# Altium footprint library ALL.PcbLib: 385 footprints (part 23 of 25)
Each footprint in its own frame and in the unit in brackets; x right, y up, seen from the top. Pads: shape width x height; smd on the part's side, far side on the other; paste and mask are expansions set on the pad; w line width, h text height; cw(c..) or ccw(c..) is an arc to the next point about the centre after c.
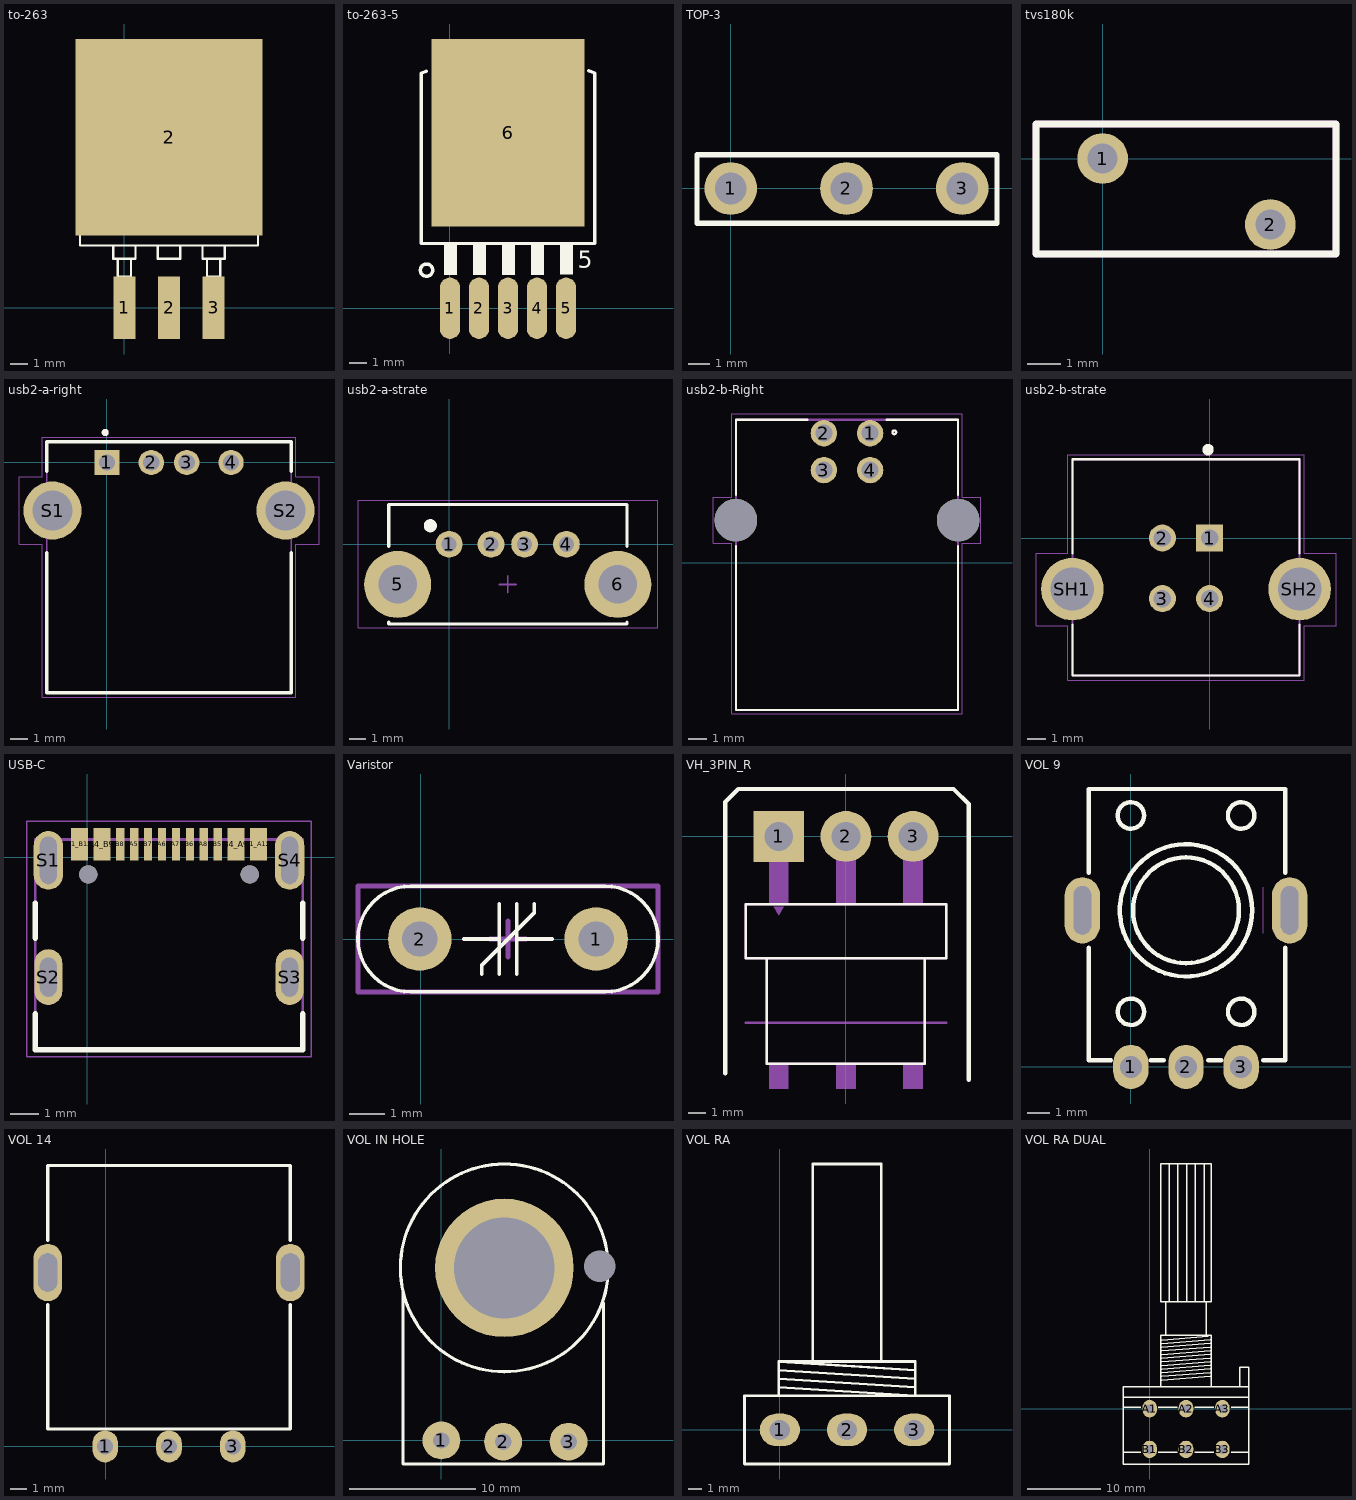
[diagram p22: the footprints below, top view; thin cyan lines are the x and y axes]

## to-263 [mil]
pads (4):
  rect 50x140 smd: 1(0,0) 2(100,0) 3(200,0)
  rect 420x440.94 smd: 2(100,382.83)
Top Overlay:
  lines w5: -25,140 -25,110 25,110 25,140 ; -15,110 -15,70 15,70 15,110 ; 75,140 75,110 125,110 125,140 ; 175,140 175,110 225,110 225,140 ; 185,110 185,70 215,70 215,110 ; -100,140 -100,520 -100,550 -70,565 270,565 300,550 300,520 300,140 -100,140
3D body "SW3dPS-TO263-3S.STEP": height 189.36, standoff 0.39, extent -95.21,-43.32 298.49,573.61

## to-263-5 [mm]
pads (6):
  oval 1.2x3.6 smd: 1(0,0) 2(1.702,0) 3(3.404,0) 4(5.105,0) 5(6.807,0)
  rect 9x11 smd: 6(3.404,10.3)
Top Overlay:
  circle w0.203: c-1.375,2.24 r0.359
  rectangle: -0.356,1.956 0.406,3.764
  rectangle: 1.346,1.956 2.108,3.764
  rectangle: 3.048,1.956 3.81,3.764
  rectangle: 4.75,1.956 5.512,3.764
  rectangle: 6.452,1.981 7.214,3.764
  lines w0.2: -1.696,13.8 -1.696,3.8 8.504,3.8 8.504,13.8 8.149,13.934
  lines w0.203: -1.656,13.8 -1.387,13.902
  text "5" at 7.493,2.367 h1.02
3D body "User Library-D2PAK TO-263-5.step": height 4.87, standoff 0, extent -1.676,-0.84 8.484,13.39

## TOP-3 [mm]
pads (3):
  round 2.5 hole 1.5 mask+0.2: 1(0,0) 2(5.5,0) 3(11,0)
Top Overlay:
  lines w0.254: -1.6,-1.651 12.649,-1.651 12.649,1.6 -1.6,1.6 -1.6,-1.651

## tvs180k [mil]
pads (2):
  round 60 hole 35.43: 1(0,0) 2(198,-78)
Top Overlay:
  lines w7.87: -78.74,-112.77 -78.74,40.77 275.59,40.77 275.59,-112.77 -78.74,-112.77
Mechanical 13:
  lines w7.87: -78.74,-112.77 275.59,-112.77 275.59,40.77 -78.74,40.77 -78.74,-112.77
3D body "MOV-07D470K (1).STEP": height 457.17, standoff -684.57, extent -78.16,-137 276.16,59.85

## usb2-a-right [mm]
pads (6):
  rect 1.428x1.428 hole 0.92: 1(0,0)
  round 1.428 hole 0.92: 2(2.5,0) 3(4.5,0) 4(7,0)
  round 3.276 hole 2.26: S1(-3.07,-2.71) S2(10.07,-2.71)
Top Overlay:
  circle w0.2: c-0.1,1.69 r0.1
  lines w0.2: -3.4,-5.08 -3.4,-12.99 10.4,-12.99 10.4,-5.08 ; -3.4,-0.49 -3.4,1.17 10.4,1.17 10.4,-0.49
Mechanical 13:
  circle w0.2: c-0.1,1.69 r0.1
  lines w0.1: -3.4,-12.99 -3.4,1.17 10.4,1.17 10.4,-12.99 -3.4,-12.99
Mechanical 15:
  lines w0.05: -4.96,-4.61 -3.65,-4.61 -3.65,-13.24 10.65,-13.24 10.65,-4.61 11.96,-4.61 11.96,-0.81 10.65,-0.81 10.65,1.42 -3.65,1.42 -3.65,-0.81 -4.96,-0.81 -4.96,-4.61
3D body "USB1130-15-A--3DModel-STEP-1.STEP": height 6.99, standoff -3.22, extent -4.299,-13.244 11.299,0.916

## usb2-a-strate [mm]
pads (6):
  round 1.6 hole 0.9: 1(0,0) 2(2.5,0) 3(4.5,0) 4(7,0)
  round 4 hole 2.3: 5(-3.07,-2.4) 6(10.07,-2.4)
Top Overlay:
  circle w0.4: c-1.123,1.105 r0.193
  lines w0.2: -3.612,-4.661 -3.612,-4.762 10.612,-4.762 10.612,-4.661 ; -3.612,-0.114 -3.612,2.375 10.612,2.375 10.612,-0.114
Mechanical 15:
  lines w0.05: -5.441,-4.991 -5.441,2.629 12.466,2.629 12.466,-4.991 -5.441,-4.991
  lines w0.1: 3,-2.4 4,-2.4 ; 3.5,-2.9 3.5,-1.9

## usb2-b-Right [mm]
pads (6):
  round 1.428 hole 0.92: 1(24.105,7.01) 2(21.605,7.01) 3(21.605,5.01) 4(24.105,5.01)
  round 2.3 hole 2.3 unplated: ""(16.835,2.3) ""(28.875,2.3)
Top Overlay:
  circle w0.127: c25.415,7.06 r0.098
  lines w0.127: 16.84,0.88 16.84,-7.98 28.87,-7.98 28.87,0.88 ; 16.84,3.66 16.84,7.73 20.695,7.73 ; 25.015,7.73 28.87,7.73 28.87,3.66
Mechanical 13:
  lines w0.127: 16.84,-7.98 28.87,-7.98 28.87,7.73 16.84,7.73 16.84,-7.98
Mechanical 15:
  lines w0.05: 15.605,1.05 16.605,1.05 16.605,-8.2 29.105,-8.2 29.105,1.05 30.105,1.05 30.105,3.55 29.105,3.55 29.105,8.05 16.605,8.05 16.605,3.55 15.605,3.55 15.605,1.05
3D body "User Library-JST_UBB-4R-D14T-4D.STEP": height 11.5, standoff -3.22, extent 15.443,-7.816 30.343,8.484

## usb2-b-strate [mm]
pads (6):
  rect 1.428x1.428 hole 0.92: 1(0,0)
  round 1.428 hole 0.92: 2(-2.5,0) 3(-2.5,-3.21) 4(0,-3.21)
  round 3.316 hole 2.3: SH1(-7.27,-2.705) SH2(4.77,-2.705)
Top Overlay:
  circle w0.4: c-0.08,4.68 r0.1
  lines w0.127: -7.265,-4.6 -7.265,-7.285 4.765,-7.285 4.765,-4.6 ; -7.265,-0.8 -7.265,4.175 4.765,4.175 4.765,-0.8
Mechanical 13:
  circle w0.4: c0.02,0 r0.1
  lines w0.127: -7.265,-7.285 -7.265,4.175 4.765,4.175 4.765,-7.285 -7.265,-7.285
Mechanical 15:
  lines w0.05: -9.2,-4.65 -9.2,-0.8 -7.515,-0.8 -7.515,4.425 5.015,4.425 5.015,-0.8 6.7,-0.8 6.7,-4.65 5.015,-4.65 5.015,-7.535 -7.515,-7.535 -7.515,-4.65 -9.2,-4.65
3D body "5787834-2.stp": height 4.32, standoff -15.32, extent -8.972,-7.252 6.178,4.204

## USB-C [mm]
pads (18):
  rect 0.6x1.15 smd: A1_B12(-0.279,0.457) A4_B9(0.521,0.457) B1_A12(6.121,0.457) B4_A9(5.321,0.457)
  rect 0.3x1.15 smd: A5(1.671,0.457) A6(2.671,0.457) A7(3.171,0.457) A8(4.171,0.457) B5(4.671,0.457) B6(3.671,0.457) B7(2.171,0.457) B8(1.171,0.457)
  oval 1.05x2.1 hole 0.6 slot 1.7 at 90 deg: S1(-1.399,-0.118) S4(7.241,-0.118)
  oval 1x2 hole 0.6 slot 1.4 at 90 deg: S2(-1.399,-4.298) S3(7.241,-4.298)
  round 0.65 hole 0.65 unplated: ""(0.031,-0.618) ""(5.811,-0.618)
Top Overlay:
  lines w0.2: -1.869,-5.618 -1.869,-6.898 7.711,-6.898 7.711,-5.618 ; -1.869,-2.898 -1.869,-1.648 ; 7.711,-2.898 7.711,-1.648
Mechanical 13:
  lines w0.1: -1.869,-6.898 7.711,-6.898 7.711,0.632 -1.869,0.632 -1.869,-6.898
Mechanical 15:
  lines w0.05: -2.179,-7.148 -2.179,1.282 8.021,1.282 8.021,-7.148 -2.179,-7.148
3D body "step_temp.STEP": height 3.31, standoff -0.85, extent -1.869,-6.883 7.711,0.827

## Varistor [mm]
pads (2):
  round 1.8 hole 1: 1(4.975,0) 2(-0.025,0)
Top Overlay:
  lines w0.1: 1.225,0 2.225,0 ; 1.725,-1 1.725,-0.75 3.225,0.75 3.225,1 ; 2.225,-1 2.225,1 ; 2.725,-1 2.725,1 ; 2.725,0 3.725,0 ; -0.275,1.5 ccw(c-0.275,0) -1.775,0 ccw(c-0.275,0) -0.275,-1.5 5.225,-1.5 ; -0.275,1.5 -0.275,1.5 ; -0.275,1.5 5.225,1.5 cw(c5.225,0) 6.725,0 cw(c5.225,0) 5.225,-1.5 ; 5.225,-1.5 5.225,-1.5
Mechanical 15:
  lines w0.15: 1.975,0 2.975,0 ; 2.475,-0.5 2.475,0.5 ; -1.775,-1.5 -1.775,1.5 6.725,1.5 6.725,-1.5 -1.775,-1.5
3D body "User Library-Warystor_5mm.STEP": height 11, standoff -1.57, extent -1.525,-1.26 6.475,1.25

## VH_3PIN_R [mm] "Power Connector"
pads (3):
  rect 3x3 / inner round 3 / far side rect 3x3 hole 1.7: 1(-3.96,0)
  round 3 hole 1.7: 2(0,0) 3(3.96,0)
Top Overlay:
  lines w0.152: -4.66,-7.2 -5.91,-7.2 -5.91,-4 5.91,-4 5.91,-7.2 4.66,-7.2 ; -4.66,-7.2 4.66,-7.2 ; -4.66,-7.2 -4.66,-13.4 4.66,-13.4 4.66,-7.2
  lines w0.254: -7.112,-13.97 -7.112,2.032 -6.35,2.794 -6.096,2.794 6.35,2.794 7.239,1.905 7.239,-14.351
Mechanical 13:
  region: -3.39,-4 -4.53,-4 -4.53,0.57 -3.39,0.57
  region: -3.39,-14.9 -4.53,-14.9 -4.53,-13.4 -3.39,-13.4
  region: 0.57,-4 -0.57,-4 -0.57,0.57 0.57,0.57
  region: 0.57,-14.9 -0.57,-14.9 -0.57,-13.4 0.57,-13.4
  region: 4.53,-4 3.39,-4 3.39,0.57 4.53,0.57
  region: 4.53,-14.9 3.39,-14.9 3.39,-13.4 4.53,-13.4
  region: -3.96,-4.65 -4.26,-4.15 -3.66,-4.15
  lines w0.152: -5.91,-11 5.91,-11 ; -5.91,-7.2 -4.66,-7.2 ; -5.91,-7.2 -5.91,-4 5.91,-4 5.91,-7.2 ; -5.91,-7.2 5.91,-7.2 ; -4.66,-7.2 4.66,-7.2 ; -4.66,-7.2 -4.66,-13.4 4.66,-13.4 4.66,-7.2 ; 4.66,-7.2 5.91,-7.2
3D body "B3PS-VH--3DModel-STEP-56544.STEP": height 8.5, standoff -3.6, extent -5.91,-14.9 5.91,0.57

## VOL 9 [mm]
pads (5):
  oval 1.6x2 / inner round 1.4 / far side oval 1.6x2 hole 1: 1(0,0) 2(2.5,0) 3(5,0)
  oval 1.6x3 hole 0.8 slot 2.2 at 90 deg: ""(-2.2,7.1) ""(7.2,7.1)
Top Overlay:
  circle w0.2: c2.5,7.1 r2.4
  circle w0.2: c2.5,7.1 r3
  circle w0.2: c5,11.4 r0.6
  circle w0.2: c0,11.4 r0.6
  circle w0.2: c5,2.5 r0.6
  circle w0.2: c0,2.5 r0.6
  lines w0.2: -1.9,5.4 -1.9,0.3 -0.9,0.3 ; -1.9,8.8 -1.9,12.6 7,12.6 7,8.8 ; 0.9,0.3 1.5,0.3 ; 3.5,0.3 4.1,0.3 ; 6,0.3 7,0.3 7,5.4
Mechanical 1:
  lines w0.008: 6,6.05 6,8.15
3D body "User Library-RV09ACF-40_RK09K1130A5R.step": height 20.1, standoff -3.7, extent -2.402,-0.128 7.349,12.422

## VOL 14 [mm]
pads (5):
  oval 1.6x2 / inner round 1.4 / far side oval 1.6x2 hole 1: 1(-0.025,0) 2(3.975,0) 3(7.975,0)
  oval 1.8x3.6 hole 1.2 slot 2.4 at 90 deg: ""(-3.625,10.9) ""(11.575,10.9)
Top Overlay:
  lines w0.2: -3.625,8.9 -3.625,1.1 11.575,1.1 11.575,8.9 ; -3.625,12.9 -3.625,17.6 11.575,17.6 11.575,12.9
3D body "User Library-RV141F-40E3-18BL-003.step": height 24.8, standoff -3.5, extent -4.224,-0.2 12.173,17.878

## VOL IN HOLE [mm]
pads (5):
  round 3 hole 1.3: 1(0,0) 2(4.9,-0.1) 3(10.1,-0.1)
  round 11 hole 8: ""(5,13.7)
  round 1.5 hole 2.5: ""(12.58,13.82)
Top Overlay:
  circle w0.254: c5,13.7 r8.25
  lines w0.254: -3.04,11.78 -3.04,-1.87 12.87,-1.87 12.87,10.92
3D body "SW3dPS-Pot.STEP": height 7.33, standoff -18.23, extent -2.918,-2.949 12.83,21.689

## VOL RA [mm]
pads (3):
  oval 3x2.4 hole 1.5: 1(0,0) 2(5,0) 3(10,0)
Top Overlay:
  lines w0.2: -0.08,2.54 -0.08,5.08 ; -0.08,3.175 10.08,2.54 10.08,5.08 -0.08,5.08 ; -0.08,3.81 10.08,3.175 ; -0.08,4.445 10.08,3.81 ; 2.46,5.08 2.46,19.781 7.54,19.781 7.54,5.08 ; 10.08,4.445 -0.08,5.08 ; -2.62,-2.54 12.62,-2.54 12.62,2.54 -2.62,2.54 -2.62,-2.54
3D body "SW3dPS-Pot.STEP": height 20.64, standoff -4, extent -2.947,-4.998 12.801,20.56

## VOL RA DUAL [mm]
pads (6):
  oval 2x2.4 hole 1.2: A1(0,0) A2(5,0) A3(10,0) B1(0,-5.6) B2(5,-5.6) B3(10,-5.6)
Top Overlay:
  lines w0.2: -3.6,-6 -1.2,-6 ; -3.6,0.2 -1.2,0.2 ; -3.6,1.6 13.6,1.6 ; 1.2,-6 3.8,-6 ; 1.2,0.2 3.8,0.2 ; 1.5,3 1.5,10.1 8.5,10.1 8.5,3 ; 1.7,3.927 8.3,4.452 ; 1.7,4.427 8.3,4.952 ; 1.7,4.927 8.3,5.452 ; 1.7,5.427 8.3,5.952 ; 1.7,5.927 8.3,6.452 ; 1.7,6.427 8.3,6.952 ; 1.7,6.927 8.3,7.452 ; 1.7,7.427 8.3,7.952 ; 1.7,7.927 8.3,8.452 ; 1.7,8.427 8.3,8.952 ; 1.7,8.927 8.3,9.452 ; 1.7,9.427 8.075,9.952 ; 2.2,10.127 2.2,14.7 ; 2.7,14.7 2.7,33.6 ; 3.9,14.7 3.9,33.6 ; 5.1,14.7 5.1,33.6 ; 6.2,-6 8.8,-6 ; 6.2,0.2 8.8,0.2 ; 6.3,14.7 6.3,33.6 ; 7.5,14.7 7.5,33.6 ; 7.8,10.127 7.8,14.7 ; 11.2,-6 13.6,-6 ; 11.2,0.2 13.6,0.2 ; 12.4,3 12.4,5.7 13.6,5.7 13.6,3 -3.6,3 -3.6,-7.6 13.6,-7.6 13.6,3.5 ; 2.2,14.7 7.8,14.7 ; 2.2,14.7 1.5,14.7 1.5,33.6 8.5,33.6 8.5,14.7 7.8,14.7
3D body "SW3dPS-ALPHA-potentiometer stereo PCB mount.STEP": height 21.2, standoff -3.3, extent -3.5,-7.49 13.5,33.36